# Altium schematic symbol library BARKO_SCHLIB.SchLib: 1064 symbols (part 4 of 11) (continued)
## HARNESS-CON-M225-4552098 (continued)
CONN RECEPT 2MM 20POS; Manufacturer: Harwin; Manufacturer Part Number: M225-4552098; Division: HARNESS; Washability: OK; .Creator: M.OZKAN; .PCBCHK: USED; Supplier 1: Mouser; Stock 1: 150; Pricing 1: 1=7,04000, 10=5,87000, 100=5,58000, 250=4,99000, 500=4,70000, 1000=4,11000 (USD); RoHS: No; ComponentLink1URL: http://www.farnell.com/datasheets/2723656.pdf?src-supplier=Farnell; ComponentLink1Description: http://www.farnell.com/datasheets/2723656.pdf?src-supplier=Farnell; Supplier Part Number 1: 855-M225-4552098; .SCHCHK: USED
pins: 1, 2, 3, 4, 5, 6, 7, 8, 9, 10, 11, 12, 13, 14, 15, 16, 17, 18, 19, 20
text: A; B

## HARNESS-CON-M225-4552698
designator J?, comment 2MM  (net tie)
CONN RECEPT 2MM 26POS; Manufacturer: Harwin; Manufacturer Part Number: M225-4552698; Division: HARNESS; Washability: OK; .Creator: M.OZKAN; .PCBCHK: USED; Supplier 1: Mouser; Stock 1: 147; Pricing 1: 1=7,37000, 10=6,15000, 100=5,84000, 250=5,22000, 500=4,92000, 1000=4,30000 (USD); RoHS: No; ComponentLink1URL: http://www.farnell.com/datasheets/2723656.pdf?src-supplier=Farnell; ComponentLink1Description: http://www.farnell.com/datasheets/2723656.pdf?src-supplier=Farnell; Supplier Part Number 1: 855-M225-4552698; .SCHCHK: USED
pins: 1, 2, 3, 4, 5, 6, 7, 8, 9, 10, 11, 12, 13, 14, 15, 16, 17, 18, 19, 20, 21, 22, 23, 24, 25, 26
text: A; B

## HARNESS-CON-M225-4555098
designator J?, comment 2MM  (net tie)
CONN RECEPT 2MM 50POS; Manufacturer: Harwin; Manufacturer Part Number: M225-4555098; Division: HARNESS; Washability: OK; .Creator: M.OZKAN; .PCBCHK: USED; Supplier 1: Mouser; Stock 1: 134; Pricing 1: 1=8,16000, 10=7,81000, 25=6,74000, 100=6,56000, 250=5,85000, 500=5,50000 (USD); RoHS: No; ComponentLink1URL: http://www.farnell.com/datasheets/2723656.pdf?src-supplier=Farnell; ComponentLink1Description: http://www.farnell.com/datasheets/2723656.pdf?src-supplier=Farnell; Supplier Part Number 1: 855-M225-4555098; .SCHCHK: USED
pins: 1, 2, 3, 4, 5, 6, 7, 8, 9, 10, 11, 12, 13, 14, 15, 16, 17, 18, 19, 20, 21, 22, 23, 24, 25, 26, 27, 28, 29, 30, 31, 32, 33, 34, 35, 36, 37, 38, 39, 40, 41, 42, 43, 44, 45, 46, 47, 48, 49, 50
text: A; B

## HARNESS-CR-1123343-1
designator CR?, comment 20-24AWG  (value not drawn)  (net tie)
CONN SOCKET 20-24AWG CRIMP TIN; Manufacturer: TE Connectivity; Manufacturer Part Number: 1123343-1; Connector Type: Connector,PCB,Signal,Socket; Number of Positions: 1; Sealable: No (Without); Gender: Female; Shielding: Unshielded; Mating Tab Width: 0.64mm; Insulation Diameter: 0.067inch; Wire/Cable Gauge: 24AWG; Wire Gauge (Min): 20AWG; .Creator: M.OZKAN; .PCBCHK: USED; Supplier 1: Digi-Key; Supplier Part Number 1: A107011CT-ND; Stock: 100150; Pricing: 1=0.16, 10=0.15, 25=0.1116, 50=0.0958, 100=0.0925, 250=0.0798, 500=0.0766, 1000=0.067, 2500=0.0606 (USD); RoHS: Yes; Mount: Cable; Contact Material: Copper Alloy,Copper; Contact Plating: Tin; Min Operating Temperature: -40°C; Max Operating Temperature: 248°C; Termination: Crimp; Package Quantity: 10000; Packaging: Tape and Reel; Orientation: Straight; Length: 15.5mm; Depth: 2.5mm; Wire Gauge (Max): 24AWG; Radiation Hardening: No; ELV: Compliant; REACH SVHC: Unknown; ComponentLink1URL: https://datasheet.ciiva.com/11721/0900766b80df8b96-11721731.pdf?src-supplier=RSComponents; ComponentLink1Description: https://datasheet.ciiva.com/11721/0900766b80df8b96-11721731.pdf?src-supplier=RSComponents; ComponentLink2URL: https://datasheet.ciiva.com/30205/eng-cat-124962-0304-534-30205203.pdf?src-supplier=Onlinecomponents.com; ComponentLink2Description: https://datasheet.ciiva.com/30205/eng-cat-124962-0304-534-30205203.pdf?src-supplier=Onlinecomponents.com; ComponentLink3URL: https://datasheet.ciiva.com/6805/jpn-cd-1123343-p1-6805364.pdf?src-supplier=Digi-Key; ComponentLink3Description: https://datasheet.ciiva.com/6805/jpn-cd-1123343-p1-6805364.pdf?src-supplier=Digi-Key; ComponentLink4URL: https://datasheet.ciiva.com/28795/1744864-28795412.pdf?src-supplier=Element14; ComponentLink4Description: https://datasheet.ciiva.com/28795/1744864-28795412.pdf?src-supplier=Element14; ComponentLink5URL: https://datasheet.ciiva.com/28795/1778349-28795413.pdf?src-supplier=Element14; ComponentLink5Description: https://datasheet.ciiva.com/28795/1778349-28795413.pdf?src-supplier=Element14; ComponentLink6URL: https://datasheet.ciiva.com/6805/jpn-cd-1123343-r-6805373.pdf?src-supplier=Digi-Key; ComponentLink6Description: https://datasheet.ciiva.com/6805/jpn-cd-1123343-r-6805373.pdf?src-supplier=Digi-Key; .SCHCHK: USED
pins: 1, 2

## HARNESS-CR-DF11-2428SC
designator CR?, comment 24-28AWG  (value not drawn)
CONN SOCKET 24-28AWG CRIMP TIN; Manufacturer: Hirose; Manufacturer Part Number: DF11-2428SC; Connector Type: Connector,PCB,Signal; Insulation Resistance: 1GR; Current Rating: 2A; Voltage Rating: 250V; Gender: Female; Contact Resistance: 30mR; Number of Contacts: 24; Wire Gauge (Max): 28AWG; Wire Gauge (Min): 24AWG; .Creator: M.OZKAN; .PCBCHK: USED; Supplier 1: Digi-Key; Supplier Part Number 1: H1504-ND; Stock: 31199; Pricing: 1=0.14, 10=0.127, 25=0.0944, 50=0.081, 100=0.0783, 250=0.0675, 500=0.0648, 1000=0.0567, 2500=0.0513 (USD); RoHS: Yes; Contact Material: Copper,Copper Alloy; Contact Plating: Tin; Min Operating Temperature: -30°C; Max Operating Temperature: 85°C; Termination: Crimp; Contact Gender: Female; Packaging: Bulk; Package Quantity: 1000; Length: 6.2mm; Wire/Cable Gauge: 28AWG; Radiation Hardening: No; Lead Free: Lead Free; REACH SVHC: No SVHC; ComponentLink1URL: https://datasheet.ciiva.com/11721/0900766b80d975f3-11721697.pdf?src-supplier=RSComponents; ComponentLink1Description: https://datasheet.ciiva.com/11721/0900766b80d975f3-11721697.pdf?src-supplier=RSComponents; ComponentLink2URL: https://datasheet.ciiva.com/16426/en-df11-20130411-16426885.pdf?src-supplier=Future+Electronics; ComponentLink2Description: https://datasheet.ciiva.com/16426/en-df11-20130411-16426885.pdf?src-supplier=Future+Electronics; ComponentLink3URL: https://datasheet.ciiva.com/14122/df11serie-eng-tds-14122150.pdf?src-supplier=Distrelec; ComponentLink3Description: https://datasheet.ciiva.com/14122/df11serie-eng-tds-14122150.pdf?src-supplier=Distrelec; ComponentLink4URL: https://datasheet.ciiva.com/5147/en-df11-20130411-258217-5147688.pdf?src-supplier=Mouser; ComponentLink4Description: https://datasheet.ciiva.com/5147/en-df11-20130411-258217-5147688.pdf?src-supplier=Mouser; .SCHCHK: USED
pins: 1, 2

## HARNESS-CRIMP-08-70-1039
designator CR?, comment CONN SOCKET 22-28AWG CRIMP TIN  (value not drawn)  (net tie)
Manufacturer: Molex; Gender: Receptacle; Shielding: Unshielded; Voltage Rating (DC): 250V; Connector Type: Connector,PCB,Signal; Max Current Rating: 3A; Contact Resistance: 20mR; Wire/Cable Gauge: 28AWG; Wire Gauge (Max): 22AWG; Division: HARNESS; Washability: OK; .Creator: M.OZKAN; .PCBCHK: USED; Supplier 1: Mouser; Manufacturer Part Number: 08-70-1039; Stock 1: 156000; Pricing 1: 12000=0,03400, 24000=0,03300, 36000=0,03100, 48000=0,02900, 96000=0,02900, 120000=0,02900 (USD); RoHS: Yes; Mount: Cable; Weight: 0.001524oz; Contact Material: Bronze,Brass; Contact Plating: Tin,Gold; Min Operating Temperature: -40°C; Max Operating Temperature: 105°C; Packaging: Tape and Reel; Orientation: Straight; Contact Gender: Female; Termination: Crimp; Voltage Rating: 250V; Current Rating: 3A; Length: 7mm; Height: 2.2mm; Depth: 2.4mm; Wire Gauge (Min): 28AWG; Radiation Hardening: No; Lead Free: Lead Free; REACH SVHC: Unknown; ComponentLink1URL: https://datasheet.ciiva.com/11721/0900766b80d8eab8-11721888.pdf?src-supplier=RSComponents; ComponentLink1Description: https://datasheet.ciiva.com/11721/0900766b80d8eab8-11721888.pdf?src-supplier=RSComponents; ComponentLink2URL: https://datasheet.ciiva.com/34303/1929524-34303296.pdf?src-supplier=Jameco; ComponentLink2Description: https://datasheet.ciiva.com/34303/1929524-34303296.pdf?src-supplier=Jameco; ComponentLink3URL: https://datasheet.ciiva.com/1091/1597769-1091799.pdf?src-supplier=Newark; ComponentLink3Description: https://datasheet.ciiva.com/1091/1597769-1091799.pdf?src-supplier=Newark; ComponentLink4URL: https://datasheet.ciiva.com/22734/1710669-22734268.pdf?src-supplier=Element14; ComponentLink4Description: https://datasheet.ciiva.com/22734/1710669-22734268.pdf?src-supplier=Element14; ComponentLink5URL: https://datasheet.ciiva.com/16468/0008701039-crimp-terminals-16468469.pdf?src-supplier=Avnet+Asia; ComponentLink5Description: https://datasheet.ciiva.com/16468/0008701039-crimp-terminals-16468469.pdf?src-supplier=Avnet+Asia; ComponentLink6URL: https://datasheet.ciiva.com/30238/0008701039-crimp-terminals-30238669.pdf?src-supplier=Onlinecomponents.com; ComponentLink6Description: https://datasheet.ciiva.com/30238/0008701039-crimp-terminals-30238669.pdf?src-supplier=Onlinecomponents.com; ComponentLink7URL: https://datasheet.ciiva.com/15217/getdatasheetpartid-168597-15217214.pdf?src-supplier=Verical; ComponentLink7Description: https://datasheet.ciiva.com/15217/getdatasheetpartid-168597-15217214.pdf?src-supplier=Verical; ComponentLink8URL: https://datasheet.ciiva.com/16132/438680008701039-crimp-terminals-16132718.pdf?src-supplier=Onlinecomponents.com; ComponentLink8Description: https://datasheet.ciiva.com/16132/438680008701039-crimp-terminals-16132718.pdf?src-supplier=Onlinecomponents.com; ComponentLink9URL: https://datasheet.ciiva.com/1091/1597769-1091499.pdf?src-supplier=Element14; ComponentLink9Description: https://datasheet.ciiva.com/1091/1597769-1091499.pdf?src-supplier=Element14; Supplier Part Number 1: 538-08-70-1039; .SCHCHK: USED
pins: 1, 2

## HARNESS-CRIMP-10127718-001LF
designator CR?, comment 20-30AWG  (value not drawn)
CONN SOCKET 20-30AWG CRIMP TIN; Manufacturer: Amphenol FCI; Manufacturer Part Number: 10127718-001LF; Gender: Female; Connector Type: Connector,PCB; Max Current Rating: 5A; Wire Gauge (Max): 30AWG; Wire Gauge (Min): 20AWG; Washability: OK; .Creator: M.OZKAN; .PCBCHK: USED; Supplier 1: Digi-Key; Supplier Part Number 1: 609-4845-1-ND; Stock: 47705; Pricing: 1=0.1, 10=0.073, 25=0.0548, 50=0.0468, 100=0.0453, 250=0.039, 500=0.0375, 1000=0.0328, 2500=0.0297 (USD); RoHS: Yes; Mount: Cable; Contact Material: Bronze; Contact Plating: Tin; Min Operating Temperature: -40°C; Max Operating Temperature: 105°C; Packaging: Tape and Reel; Termination: Crimp; Orientation: Straight; Length: 10.8mm; Wire/Cable Gauge: 20AWG; REACH SVHC: No SVHC; ComponentLink1URL: http://portal.fciconnect.com/Comergent//fci/drawing/10127718-001lf.pdf?src-supplier=Digi-Key; ComponentLink1Description: http://portal.fciconnect.com/Comergent//fci/drawing/10127718-001lf.pdf?src-supplier=Digi-Key; ComponentLink2URL: http://www.farnell.com/datasheets/1877473.pdf?src-supplier=Element14; ComponentLink2Description: http://www.farnell.com/datasheets/1877473.pdf?src-supplier=Element14; ComponentLink3URL: http://portal.fciconnect.com/Comergent//fci/drawing/10127718.pdf?src-supplier=Avnet; ComponentLink3Description: http://portal.fciconnect.com/Comergent//fci/drawing/10127718.pdf?src-supplier=Avnet; .SCHCHK: USED
pins: 1, 2

## HARNESS-CRIMP-M225-2530046
designator CR?, comment Harwin M225 Crimp  (value not drawn)  (net tie)
CONN SOCKET 22-24AWG CRIMP TIN; Manufacturer Part Number: M225-2530046; Division: HARNESS; Washability: OK; .Creator: M.OZKAN; .PCBCHK: USED; Supplier 1: Mouser; Manufacturer: Harwin; Stock 1: 14624; Pricing 1: 1=0,46000, 10=0,32000, 100=0,26400, 1000=0,22000, 2500=0,19700, 10000=0,16100 (USD); RoHS: No; ComponentLink1URL: http://www.farnell.com/datasheets/2723656.pdf?src-supplier=Farnell; ComponentLink1Description: http://www.farnell.com/datasheets/2723656.pdf?src-supplier=Farnell; Supplier Part Number 1: 855-M225-2530046; .SCHCHK: USED
pins: 1, 2

## HARNESS-WIRE-24AWG BLACK
designator W?, comment 24AWG SIYAH  (value not drawn)
HOOK-UP STRND 24AWG BLCK FEET; Manufacturer: TE Connectivity; Manufacturer Part Number: 22759/32-24-0; Voltage: 600V; Number of Conductors: 1; Insulation Diameter: 0.037inch; Division: HARNESS; Washability: OK; .Creator: M.OZKAN; .PCBCHK: USED; Supplier 1: Mouser; Stock 1: 10000; Pricing 1: 1000=0,19500 (USD); RoHS: Yes; Mount: Cable; Insulation Material: ETFE; Color: Black; Min Operating Temperature: -65°C; Max Operating Temperature: 150°C; Package Quantity: 5000; Wire/Cable Gauge: 24AWG; ComponentLink1URL: https://datasheet.ciiva.com/30116/htmls2275932-24-0-0-30116889.pdf?src-supplier=Onlinecomponents.com; ComponentLink1Description: https://datasheet.ciiva.com/30116/htmls2275932-24-0-0-30116889.pdf?src-supplier=Onlinecomponents.com; ComponentLink2URL: https://datasheet.ciiva.com/69/eng-cd-55a0111-r-69820.pdf?src-supplier=Digi-Key; ComponentLink2Description: https://datasheet.ciiva.com/69/eng-cd-55a0111-r-69820.pdf?src-supplier=Digi-Key; Supplier Part Number 1: 650-22759/32-24-0; .SCHCHK: USED
pins: 0, 1

## HARNESS-WIRE-24AWG RED
designator W?, comment 24AWG RED  (value not drawn)
HOOK-UP STRND 24AWG RED FEE; Manufacturer: TE Connectivity; Manufacturer Part Number: 22759/32-24-2; Conductor Material: Copper,Tin; Number of Conductors: 1; Voltage: 600V; Insulation Diameter: 0.037inch; Division: HARNESS; Washability: OK; .Creator: M.OZKAN; .PCBCHK: USED; Supplier 1: Digi-Key; Stock 1: 6548; Pricing 1: 1=0,40000, 5=0,35400, 10=0,33700, 25=0,31560, 50=0,30060, 100=0,28560 (USD); RoHS: Yes; Mount: Cable; Insulation Material: ETFE; Color: Red; Min Operating Temperature: -65°C; Max Operating Temperature: 150°C; Package Quantity: 5000; Wire/Cable Gauge: 24AWG; Radiation Hardening: No; ComponentLink1URL: https://datasheet.ciiva.com/41802/eng-cd-55a0111-r-41802664.pdf?src-supplier=Digi-Key; ComponentLink1Description: https://datasheet.ciiva.com/41802/eng-cd-55a0111-r-41802664.pdf?src-supplier=Digi-Key; ComponentLink2URL: https://datasheet.ciiva.com/69/eng-cd-55a0111-r-69817.pdf?src-supplier=Digi-Key; ComponentLink2Description: https://datasheet.ciiva.com/69/eng-cd-55a0111-r-69817.pdf?src-supplier=Digi-Key; Supplier Part Number 1: 22759/32-24-2-DS-ND; .SCHCHK: USED
pins: 0, 1
text: 24AWG KIRMIZI

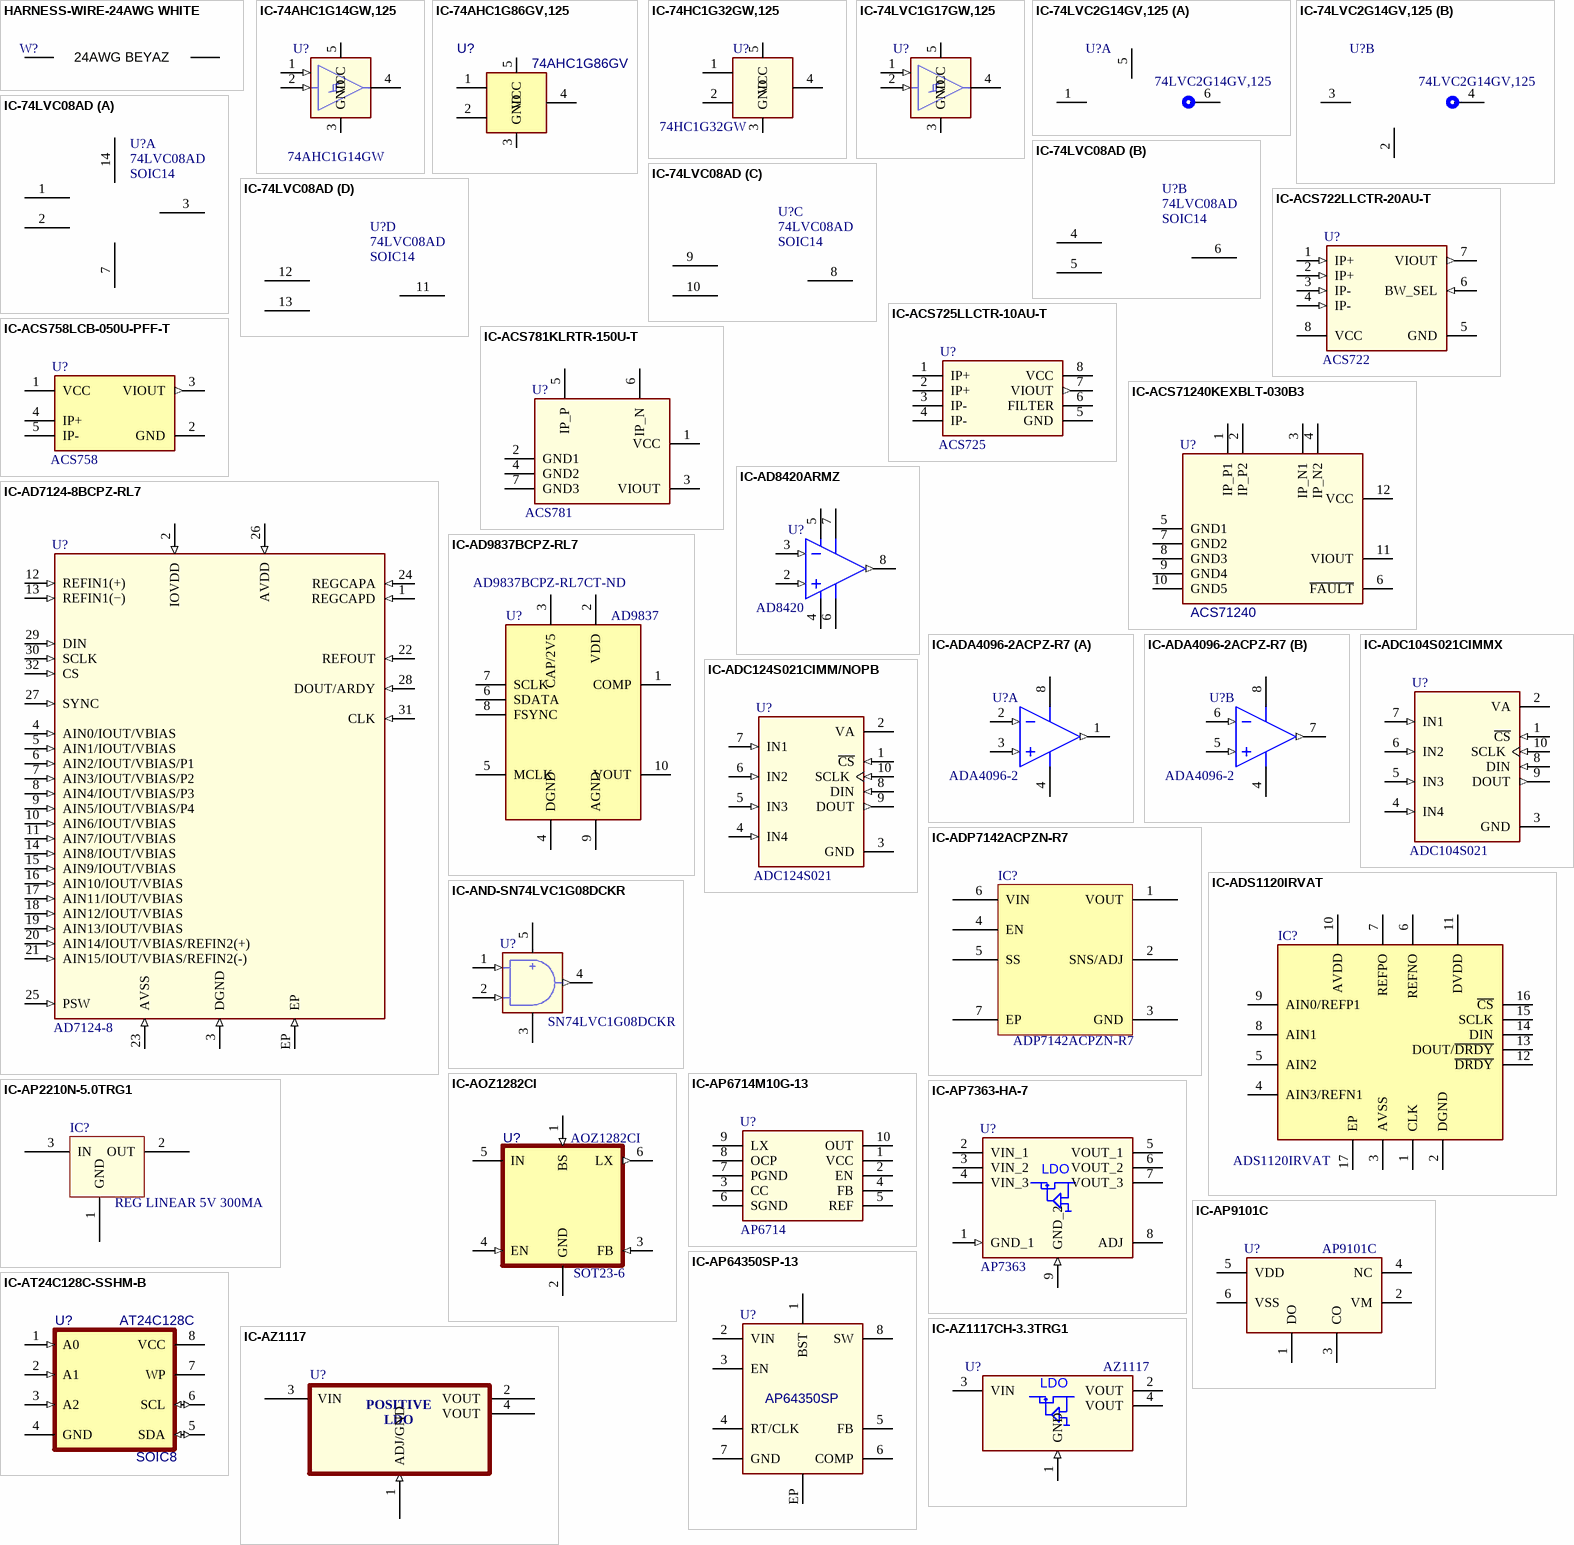
[diagram p12: symbols HARNESS-WIRE-24AWG WHITE to IC-AZ1117CH-3.3TRG1]

## HARNESS-WIRE-24AWG WHITE
designator W?, comment 24AWG White  (value not drawn)
HOOK-UP STRND 24AWG WHITE FT; Manufacturer: TE Connectivity; Manufacturer Part Number: 81044/12-24-9; Conductor Material: Copper,Tin; Number of Conductors: 1; Voltage: 600V; Wire/Cable Diameter: 1.02mm; Insulation Diameter: 0.04inch; Insulation Thickness: 0.003inch; Division: HARNESS; Washability: OK; .Creator: M.OZKAN; .PCBCHK: USED; Supplier 1: Mouser; Stock 1: 5000; Pricing 1: 5000=0,17200 (USD); RoHS: Yes; Mount: Cable; Color: White; Insulation Material: Polyvinyl; Min Operating Temperature: -65°C; Max Operating Temperature: 150°C; Package Quantity: 5000; Max Voltage Rating (AC): 600V; Wire/Cable Gauge: 24AWG; ComponentLink1URL: https://datasheet.ciiva.com/69/eng-cd-44a0111-p1-69736.pdf?src-supplier=Digi-Key; ComponentLink1Description: https://datasheet.ciiva.com/69/eng-cd-44a0111-p1-69736.pdf?src-supplier=Digi-Key; ComponentLink2URL: https://datasheet.ciiva.com/30223/eng-ds-1654025-wc-h-pp-1204-30223674.pdf?src-supplier=Onlinecomponents.com; ComponentLink2Description: https://datasheet.ciiva.com/30223/eng-ds-1654025-wc-h-pp-1204-30223674.pdf?src-supplier=Onlinecomponents.com; ComponentLink3URL: https://datasheet.ciiva.com/41799/eng-cd-44a0111-p1-41799644.pdf?src-supplier=Digi-Key; ComponentLink3Description: https://datasheet.ciiva.com/41799/eng-cd-44a0111-p1-41799644.pdf?src-supplier=Digi-Key; Supplier Part Number 1: 650-81044/12-24-9; .SCHCHK: USED
pins: 0, 1
text: 24AWG BEYAZ

## IC-74AHC1G14GW,125
designator U?, comment 74AHC1G14GW
IC INVERTER SCHMITT 1CH 5TSSOP; Manufacturer: Nexperia; Manufacturer Part Number: 74AHC1G14GW,125; Washability: OK; .Creator: M.OZKAN; .PCBCHK: USED; Supplier 1: Digi-Key; Supplier Part Number 1: 1727-3149-1-ND; Stock: 5831; Pricing: 1=0.22, 10=0.178, 25=0.1492, 100=0.0944, 250=0.0729, 500=0.0621, 1000=0.0422 (USD); RoHS: No; ComponentLink1URL: http://www.farnell.com/datasheets/2014360.pdf?src-supplier=Farnell; ComponentLink1Description: http://www.farnell.com/datasheets/2014360.pdf?src-supplier=Farnell; .SCHCHK: USED
footprint TSSOP5 (SOT23, 5-Leads, Body 2.15x1.4mm, Pitch 0.65mm, IPC High Density)
pins: 1 NC (in), 2 A (in), 3 GND, 4 Y (hiz), 5 VCC

## IC-74AHC1G86GV,125
designator U?, comment 74AHC1G86GV
IC GATE XOR 1CH 2-INP 5TSOP; Manufacturer: NXP Semiconductors; Manufacturer Part Number: 74AHC1G86GV,125; Max Supply Voltage: 5.5V; Min Supply Voltage: 2V; Quiescent Current: 1uA; Propagation Delay: 11.5ns; Operating Supply Voltage: 5V; Number of Outputs: 1; Number of Inputs: 2; Low Level Output Current: 8mA; High Level Output Current: -8mA; .PCBCHK: USED; .Creator: F:TALI; Washability: OK; Supplier 1: Digi-Key; Stock 1: 0; Mount: Surface Mount; Number of Pins: 5; Contact Plating: Tin; Min Operating Temperature: -40°C; Max Operating Temperature: 125°C; Packaging: Tape and Reel; Package Quantity: 3000; Number of Gates: 1; Number of Input Lines: 2; Number of Output Lines: 1; Number of Circuits: 1; Number of Elements: 1; Turn-On Delay Time: 11.5ns; Radiation Hardening: No; Lead Free: Lead Free; ComponentLink1URL: http://www.nxp.com/documents/data_sheet/74AHC_AHCT1G86.pdf; ComponentLink1Description: http://www.nxp.com/documents/data_sheet/74AHC_AHCT1G86.pdf; ComponentLink2URL: https://www.verical.com/server-webapp/html/getDatasheet?partID=634212; ComponentLink2Description: https://www.verical.com/server-webapp/html/getDatasheet?partID=634212; Supplier Part Number 1: 568-4824-1-ND; Logic Function: XOR; .SCHCHK: USED; Case/Package: TSOP
footprint TSOP5
pins: 1 B, 2 A, 3 GND, 4 Y, 5 VCC

## IC-74HC1G32GW,125
designator U?, comment 74HC1G32GW
IC GATE OR 1CH 2-INP 5TSSOP; Manufacturer: Nexperia; Manufacturer Part Number: 74HC1G32GW,125; Washability: OK; .Creator: M.OZKAN; .PCBCHK: USED; Supplier 1: Digi-Key; Supplier Part Number 1: 1727-6040-1-ND; Stock 1: 15603; Pricing 1: 1=0.31000, 10=0.25400, 25=0.21240, 100=0.13450, 250=0.10380, 500=0.08846, 1000=0.06015 (USD); RoHS: No; ComponentLink1URL: https://assets.nexperia.com/documents/data-sheet/74HC_HCT1G32.pdf?src-supplier=Digi-Key; ComponentLink1Description: https://assets.nexperia.com/documents/data-sheet/74HC_HCT1G32.pdf?src-supplier=Digi-Key; .SCHCHK: USED
footprint TSSOP5 (SOT23, 5-Leads, Body 2.15x1.4mm, Pitch 0.65mm, IPC High Density)
pins: 1 B, 2 A, 3 GND, 4 Y, 5 VCC

## IC-74LVC1G17GW,125
designator U?, comment 74LVC1G17GW  (value not drawn)